# Altium footprint library pcb2D3D库101.PcbLib: 411 footprints (part 12 of 26)
Each footprint in its own frame and in the unit in brackets; x right, y up, seen from the top. Pads: shape width x height; smd on the part's side, far side on the other; paste and mask are expansions set on the pad; w line width, h text height; cw(c..) or ccw(c..) is an arc to the next point about the centre after c.
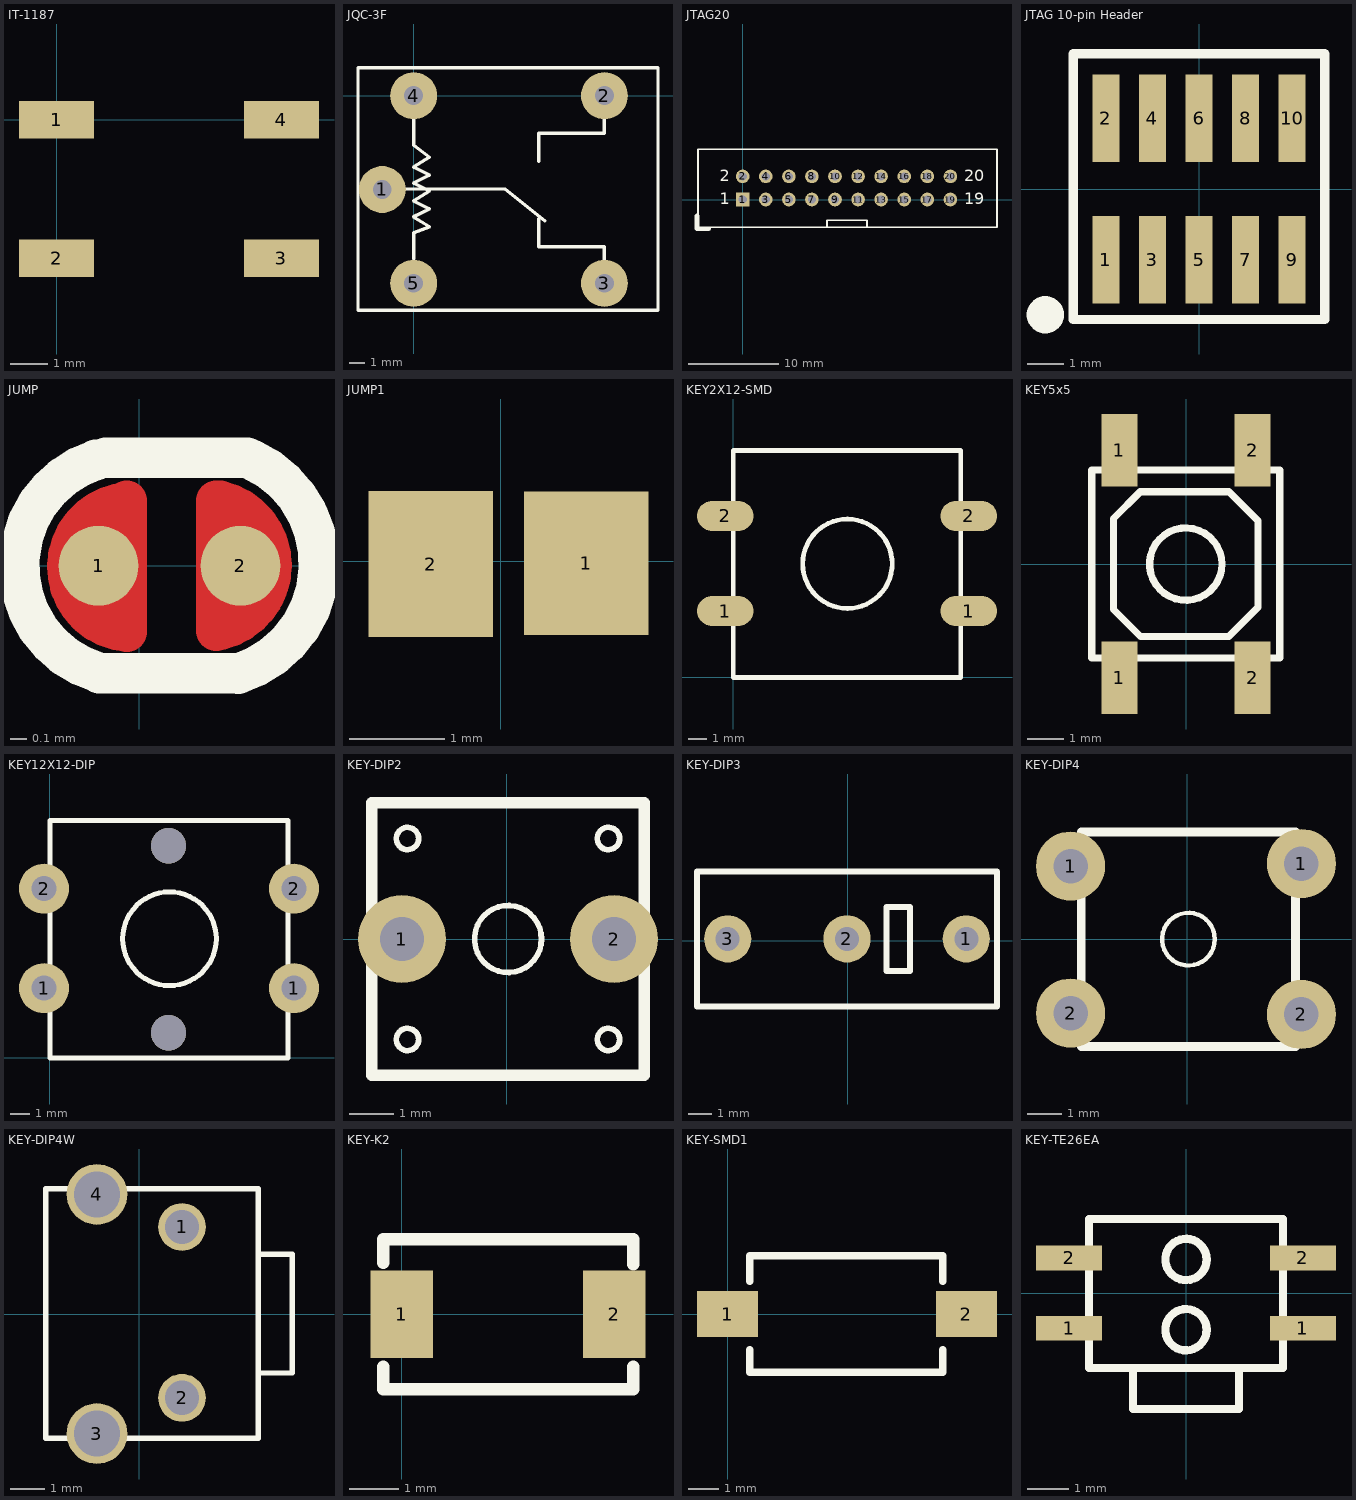
[diagram p11: the footprints below, top view; thin cyan lines are the x and y axes]

## IT-1187 [mm]
pads (4):
  rect 2x1 smd: 1(0,0) 2(0,-3.7) 3(6,-3.7) 4(6,0)
3D body "User Library-IT-1187.STEP": height 1.5, standoff 0, extent -0.254,-4.454 6.146,0.746

## JQC-3F [mm]
pads (5):
  round 3 hole 1.2: 1(-2,-6) 2(12.2,0) 3(12.2,-12) 4(0,0) 5(0,-12)
TopOverlay:
  lines w0.22: -0.508,-5.969 5.842,-5.969 8.382,-8.001 ; 0,-10.414 0,-8.763 1.016,-8.382 0,-7.747 1.016,-7.239 0,-6.731 1.016,-6.096 0,-5.588 1.016,-5.08 0,-4.572 1.016,-3.937 0,-3.175 0,-1.524 ; 8.001,-7.874 8.001,-9.652 12.192,-9.652 12.192,-10.541 ; 8.001,-4.191 8.001,-2.413 12.192,-2.413 12.192,-1.524 ; -3.556,-13.716 15.621,-13.716 15.621,1.778 -3.556,1.778 -3.556,-13.716
3D body "User Library-SONGLE Relay SRU-12VDC-SL-C.STEP": height 15.3, standoff -5, extent -3.454,-13.722 15.646,1.778

## JTAG20 [mm]
pads (20):
  rect 1.5x1.5 hole 0.9: 1(0,0)
  round 1.5 hole 0.9: 2(0,2.54) 3(2.54,0) 4(2.54,2.54) 5(5.08,0) 6(5.08,2.54) 7(7.62,0) 8(7.62,2.54) 9(10.16,0) 10(10.16,2.54) 11(12.7,0) 12(12.7,2.54) 13(15.24,0) 14(15.24,2.54) 15(17.78,0) 16(17.78,2.54) 17(20.32,0) 18(20.32,2.54) 19(22.86,0) 20(22.86,2.54)
TopOverlay:
  lines w0.2: 9.271,-3.023 9.271,-2.286 13.691,-2.286 13.691,-3.048 ; -4.902,-3.048 -4.902,5.537 27.991,5.537 27.991,-3.048 -4.902,-3.048
  lines w0.5: -5.029,-1.803 -5.029,-3.226 -3.734,-3.226
  text "20" at 24.384,2.032 h1.27
  text "19" at 24.384,-0.508 h1.27
  text "1" at -2.54,-0.508 h1.27
  text "2" at -2.54,2.032 h1.27
3D body "SW3dPS-PinBox Connector_20Pin.STEP": height 10.9, standoff -3, extent -5.009,-3.181 27.991,5.619

## JTAG 10-pin Header [mil] "Jtag port SMT"
pads (10):
  rect 29x94 smd: 1(-100,-76) 2(-100,76) 3(-50,-76) 4(-50,76) 5(0,-76) 6(0,76) 7(50,-76) 8(50,76) 9(100,-76) 10(100,76)
TopOverlay:
  circle w20: c-165,-135 r10
  lines w10: -135,-140 135,-140 135,145 -135,145 -135,-140
3D body "Harwin_M52-040000S0545_HDRV10W46P254X127_2X5_635X720X777.STEP": height 303.15, standoff -2.76, extent -124.8,-142.91 125.2,140.55

## JUMP [mm]
pads (2):
  round 0.5 smd: 1(-0.254,0) 2(0.635,0)
TopLayer:
  lines w0.254: -0.129,0.39 ccw(c-0.043,-0.007) -0.077,-0.412 -0.076,0.406 ; 0.483,-0.406 0.483,0.406 ; 0.508,0.406 cw(c0.417,0.003) 0.51,-0.399
TopOverlay:
  lines w0.254: -0.272,0.663 ccw(c-0.054,-0.001) -0.259,-0.668 ; -0.249,-0.673 0.615,-0.673 ; -0.208,0.678 0.678,0.678 ; 0.62,-0.676 ccw(c0.409,0.011) 0.706,0.665
TopSolder:
  lines w1.143: -0.076,0 0.483,0

## JUMP1 [mm]
pads (2):
  rect 1.3x1.5 smd: 1(0.897,-0.023)
  rect 1.3x1.524 smd: 2(-0.73,-0.03)

## KEY2X12-SMD [mm]
pads (4):
  oval 3x1.6 smd: 1(-0.43,3.532) 1(12.524,3.532) 2(-0.43,8.588) 2(12.524,8.588)
TopOverlay:
  circle w0.254: c6.071,6.045 r2.378
  lines w0.254: 0,0 0,12.065 12.09,12.065 12.09,0 0,0
3D body "User Library-SWT_12x12_SMD.step": height 4, standoff 0, extent -0.629,0.065 12.821,12.065

## KEY5x5 [mm]
pads (4):
  rect 1x2 smd: 1(-1.841,-3.15) 1(-1.841,3.15) 2(1.841,-3.15) 2(1.841,3.15)
TopOverlay:
  circle w0.2: c-0.007,-0.003 r1
  lines w0.2: -2.607,-2.603 -2.607,2.597 2.593,2.597 2.593,-2.603 -2.607,-2.603 ; -2.007,-1.257 -1.261,-2.003 1.185,-2.003 1.993,-1.194 1.993,1.194 1.19,1.997 -1.267,1.997 -2.007,1.257 -2.007,-1.257
3D body: height 1.2, standoff 0, extent -2.6,-2.6 2.6,2.6
3D body: height 2.5, standoff 1.2, extent -0.992,-0.998 1,0.998

## KEY12X12-DIP [mm]
pads (4):
  round 2.54 hole 1.27: 1(-0.303,3.532) 1(12.397,3.532) 2(-0.303,8.588) 2(12.397,8.588)
via 6.02,1.27 diameter 1.8 hole 1.8
via 6.02,10.77 diameter 1.8 hole 1.8
TopOverlay:
  circle w0.254: c6.071,6.045 r2.378
  lines w0.254: 0,0 0,12.065 12.09,12.065 12.09,0 0,0
3D body "SWT9-1.step": height 7.3, standoff -3.5, extent -0.455,0 12.545,12

## KEY-DIP2 [mm] "6X6"
pads (2):
  round 2 hole 1: 1(-2.379,0.004) 2(2.447,0.004)
TopOverlay:
  circle w0.127: c0.034,0.004 r0.762
  circle w0.127: c-2.252,2.29 r0.254
  circle w0.127: c2.32,2.29 r0.254
  circle w0.127: c2.32,-2.282 r0.254
  circle w0.127: c-2.252,-2.282 r0.254
  lines w0.254: -3.065,-3.095 3.133,-3.095 3.133,3.103 -3.065,3.103 -3.065,-3.095
3D body "SW6X6.stp": height 4.3, standoff -14, extent -2.949,-3.097 3.051,3.103

## KEY-DIP3 [mm]
pads (3):
  round 2 hole 1.016: 1(5.029,0.087) 3(-5.071,0.087)
  oval 2.007x2 hole 1.016: 2(-0.021,0.087)
TopOverlay:
  lines w0.254: -6.371,-2.773 6.329,-2.773 ; -6.371,-2.763 -6.371,2.937 6.329,2.937 6.329,-2.763 ; 1.649,-1.263 1.649,1.437 2.649,1.437 2.649,-1.263 1.649,-1.263
3D body "33308.stp": height 14.5, standoff -3.5, extent -6.375,-2.798 6.425,3.002

## KEY-DIP4 [mm] "6X6"
pads (4):
  round 2 hole 1: 1(-3.373,2.116) 1(3.299,2.189) 2(-3.373,-2.134) 2(3.299,-2.172)
TopOverlay:
  circle w0.127: c0.034,0.004 r0.762
  lines w0.254: -3.065,-3.095 -3.065,3.103 3.133,3.103 3.133,-3.095 -3.065,-3.095
3D body "4pin_TS-1143-WP.STEP": height 4.3, standoff -3.5, extent -4.125,-3.27 4.143,3.23

## KEY-DIP4W [mil]
pads (4):
  round 55 hole 39.37: 1(49,100.3) 2(49,-96.56)
  round 70 hole 53.15: 3(-49,-137.8) 4(-49,137.8)
TopOverlay:
  lines w6: 136.84,-68.06 176,-68.06 176,68.94 136.84,68.94 ; -108,-143.06 136.84,-143.06 136.84,144.35 -108,144.35 -108,-143.06
3D body "B3F_3100.STEP": height 137.8, standoff -291.34, extent -108.48,-166.84 173.02,175.68

## KEY-K2 [mil]
pads (2):
  rect 50x70 smd: 1(0,0) 2(170,0)
TopOverlay:
  lines w10: -15,-42 -15,-60 185,-60 185,-42 ; -15,41 -15,60 185,60 185,40
3D body "SW.STEP": height 78.74, standoff -3.94, extent -12.6,-58 182.6,60.11

## KEY-SMD1 [mm]
pads (2):
  rect 2x1.5 smd: 1(0,0) 2(7.8,0)
TopOverlay:
  lines w0.254: 0.725,-1.168 0.725,-1.9 7.025,-1.9 7.025,-1.168 ; 0.725,1.067 0.725,1.9 7.025,1.9 7.025,1.067
3D body "SMD按键.STEP": height 2.5, standoff 0, extent -0.059,-1.945 7.831,1.905

## KEY-TE26EA [mm]
pads (4):
  rect 1.6x0.6 smd: 1(-2.832,-0.851) 1(2.832,-0.851) 2(-2.832,0.851) 2(2.832,0.851)
TopOverlay:
  circle w0.2: c0,0.813 r0.5
  circle w0.2: c0,-0.889 r0.5
  lines w0.2: -1.283,-1.836 -1.283,-2.807 1.283,-2.807 1.283,-1.836 ; -2.349,-1.816 -2.349,1.791 2.349,1.791 2.349,-1.816 -2.349,-1.816
3D body "零": height 1.63, standoff -0.02, extent -2.941,-2.807 2.959,1.693